# Altium schematic symbol library jlcpcb_2025_04_capacitors_extended_0201.schlib: 1175 symbols (part 5 of 7)
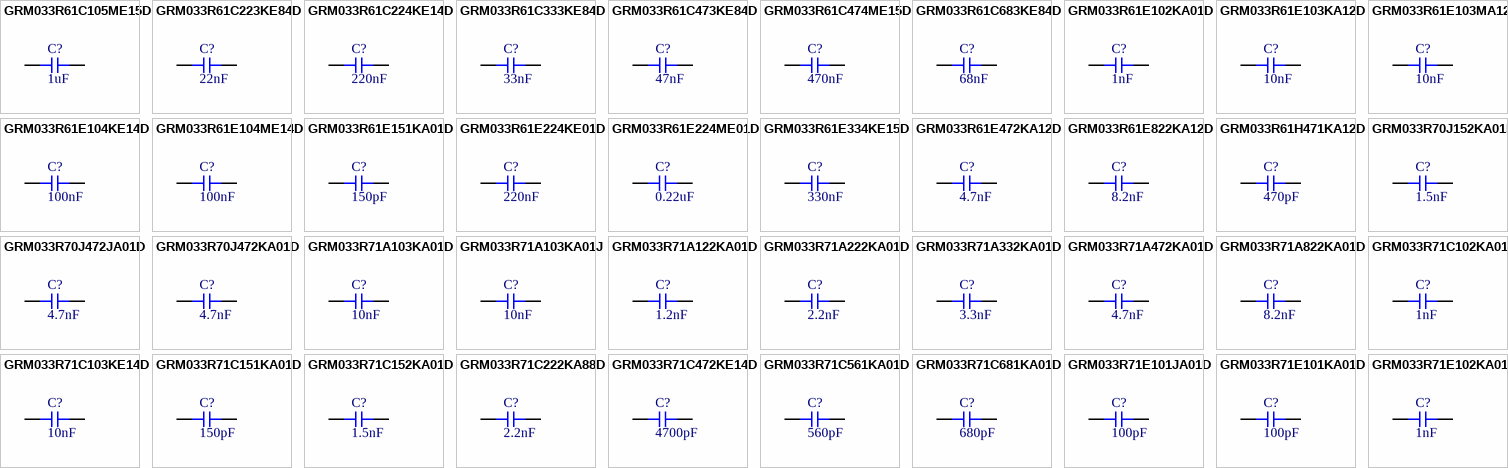
[diagram p33: symbols GRM033R61C105ME15D to GRM033R71E102KA01D]

## GRM033R61H471KA12D
designator C?  Capacitance: 470pF  (hidden comment: *)
Capacitor, Ceramic (MLCC), 470pF, ±10%, null, X5R, ±10%, SMD 0201; Manufacturer: Murata Electronics; Manufacturer Part Number: GRM033R61H471KA12D; Package Size: 0201; JLCPCB Basic Part: No; JLCPCB Part Number: C710827; Supplier 1: LCSC; Category: Capacitors - MLCC; Supplier Part Number 1: C710827; Tolerance: ±10%; Voltage Rating: null; Temperature Coefficient: X5R; RoHS: Yes; ComponentLink1Description: Datasheet; ComponentLink1URL: https://wmsc.lcsc.com/wmsc/upload/file/pdf/v2/lcsc/2308111812_Murata-Electronics-GRM033R61H471KA12D_C710827.pdf; ComponentLink2Description: JLCPCB Part URL; ComponentLink2URL: https://jlcpcb.com/partdetail/C710827; ComponentLink3Description: LCSC Part URL; ComponentLink3URL: https://lcsc.com/product-detail/Multilayer-Ceramic-Capacitors-MLCC---SMD-SMT_Murata-Electronics-Murata-Electronics-GRM033R61H471KA12D_C710827.html
footprint CAP-0201 (0201 (0603M) Capacitor)
pins: 1, 2

## GRM033R70J152KA01D
designator C?  Capacitance: 1.5nF  (hidden comment: *)
Capacitor, Ceramic (MLCC), 1.5nF, ±10%, 6.3V, X7R, ±10%, SMD 0201; Manufacturer: Murata Electronics; Manufacturer Part Number: GRM033R70J152KA01D; Package Size: 0201; JLCPCB Basic Part: No; JLCPCB Part Number: C2173993; Supplier 1: LCSC; Category: Capacitors - MLCC; Supplier Part Number 1: C2173993; Tolerance: ±10%; Voltage Rating: 6.3V; Temperature Coefficient: X7R; RoHS: Yes; ComponentLink1Description: Datasheet; ComponentLink1URL: https://wmsc.lcsc.com/wmsc/upload/file/pdf/v2/lcsc/2108051830_Murata-Electronics-GRM033R70J152KA01D_C2173993.pdf; ComponentLink2Description: JLCPCB Part URL; ComponentLink2URL: https://jlcpcb.com/partdetail/C2173993; ComponentLink3Description: LCSC Part URL; ComponentLink3URL: https://lcsc.com/product-detail/Multilayer-Ceramic-Capacitors-MLCC---SMD-SMT_Murata-Electronics-Murata-Electronics-GRM033R70J152KA01D_C2173993.html
footprint CAP-0201 (0201 (0603M) Capacitor)
pins: 1, 2

## GRM033R70J472JA01D
designator C?  Capacitance: 4.7nF  (hidden comment: *)
Capacitor, Ceramic (MLCC), 4.7nF, ±5%, 6.3V, X7R, ±5%, SMD 0201; Manufacturer: Murata Electronics; Manufacturer Part Number: GRM033R70J472JA01D; Package Size: 0201; JLCPCB Basic Part: No; JLCPCB Part Number: C909904; Supplier 1: LCSC; Category: Capacitors - MLCC; Supplier Part Number 1: C909904; Tolerance: ±5%; Voltage Rating: 6.3V; Temperature Coefficient: X7R; RoHS: Yes; ComponentLink1Description: Datasheet; ComponentLink1URL: https://wmsc.lcsc.com/wmsc/upload/file/pdf/v2/lcsc/2201242100_Murata-Electronics-GRM033R70J472JA01D_C909904.pdf; ComponentLink2Description: JLCPCB Part URL; ComponentLink2URL: https://jlcpcb.com/partdetail/C909904; ComponentLink3Description: LCSC Part URL; ComponentLink3URL: https://lcsc.com/product-detail/Multilayer-Ceramic-Capacitors-MLCC---SMD-SMT_Murata-Electronics-Murata-Electronics-GRM033R70J472JA01D_C909904.html
footprint CAP-0201 (0201 (0603M) Capacitor)
pins: 1, 2

## GRM033R70J472KA01D
designator C?  Capacitance: 4.7nF  (hidden comment: *)
Capacitor, Ceramic (MLCC), 4.7nF, ±10%, 6.3V, X7R, ±10%, SMD 0201; Manufacturer: Murata Electronics; Manufacturer Part Number: GRM033R70J472KA01D; Package Size: 0201; JLCPCB Basic Part: No; JLCPCB Part Number: C237568; Supplier 1: LCSC; Category: Capacitors - MLCC; Supplier Part Number 1: C237568; Tolerance: ±10%; Voltage Rating: 6.3V; Temperature Coefficient: X7R; RoHS: Yes; ComponentLink1Description: Datasheet; ComponentLink1URL: https://wmsc.lcsc.com/wmsc/upload/file/pdf/v2/lcsc/2109152030_Murata-Electronics-GRM033R70J472KA01D_C237568.pdf; ComponentLink2Description: JLCPCB Part URL; ComponentLink2URL: https://jlcpcb.com/partdetail/C237568; ComponentLink3Description: LCSC Part URL; ComponentLink3URL: https://lcsc.com/product-detail/Multilayer-Ceramic-Capacitors-MLCC---SMD-SMT_Murata-Electronics-Murata-Electronics-GRM033R70J472KA01D_C237568.html
footprint CAP-0201 (0201 (0603M) Capacitor)
pins: 1, 2

## GRM033R71A103KA01D
designator C?  Capacitance: 10nF  (hidden comment: *)
Capacitor, Ceramic (MLCC), 10nF, ±10%, 10V, X7R, ±10%, SMD 0201; Manufacturer: Murata Electronics; Manufacturer Part Number: GRM033R71A103KA01D; Package Size: 0201; JLCPCB Basic Part: No; JLCPCB Part Number: C76941; Supplier 1: LCSC; Category: Capacitors - MLCC; Supplier Part Number 1: C76941; Tolerance: ±10%; Voltage Rating: 10V; Temperature Coefficient: X7R; RoHS: Yes; ComponentLink1Description: Datasheet; ComponentLink1URL: https://wmsc.lcsc.com/wmsc/upload/file/pdf/v2/lcsc/1811081513_Murata-Electronics-GRM033R71A103KA01D_C76941.pdf; ComponentLink2Description: JLCPCB Part URL; ComponentLink2URL: https://jlcpcb.com/partdetail/C76941; ComponentLink3Description: LCSC Part URL; ComponentLink3URL: https://lcsc.com/product-detail/Multilayer-Ceramic-Capacitors-MLCC---SMD-SMT_Murata-Electronics-Murata-Electronics-GRM033R71A103KA01D_C76941.html
footprint CAP-0201 (0201 (0603M) Capacitor)
pins: 1, 2

## GRM033R71A103KA01J
designator C?  Capacitance: 10nF  (hidden comment: *)
Capacitor, Ceramic (MLCC), 10nF, ±10%, 10V, X7R, ±10%, SMD 0201; Manufacturer: Murata Electronics; Manufacturer Part Number: GRM033R71A103KA01J; Package Size: 0201; JLCPCB Basic Part: No; JLCPCB Part Number: C882546; Supplier 1: LCSC; Category: Capacitors - MLCC; Supplier Part Number 1: C882546; Tolerance: ±10%; Voltage Rating: 10V; Temperature Coefficient: X7R; RoHS: Yes; ComponentLink1Description: Datasheet; ComponentLink1URL: https://wmsc.lcsc.com/wmsc/upload/file/pdf/v2/lcsc/2204152015_Murata-Electronics-GRM033R71A103KA01J_C882546.pdf; ComponentLink2Description: JLCPCB Part URL; ComponentLink2URL: https://jlcpcb.com/partdetail/C882546; ComponentLink3Description: LCSC Part URL; ComponentLink3URL: https://lcsc.com/product-detail/Multilayer-Ceramic-Capacitors-MLCC---SMD-SMT_Murata-Electronics-Murata-Electronics-GRM033R71A103KA01J_C882546.html
footprint CAP-0201 (0201 (0603M) Capacitor)
pins: 1, 2

## GRM033R71A122KA01D
designator C?  Capacitance: 1.2nF  (hidden comment: *)
Capacitor, Ceramic (MLCC), 1.2nF, ±10%, 10V, X7R, ±10%, SMD 0201; Manufacturer: Murata Electronics; Manufacturer Part Number: GRM033R71A122KA01D; Package Size: 0201; JLCPCB Basic Part: No; JLCPCB Part Number: C913747; Supplier 1: LCSC; Category: Capacitors - MLCC; Supplier Part Number 1: C913747; Tolerance: ±10%; Voltage Rating: 10V; Temperature Coefficient: X7R; RoHS: Yes; ComponentLink1Description: Datasheet; ComponentLink1URL: https://wmsc.lcsc.com/wmsc/upload/file/pdf/v2/lcsc/2302062030_Murata-Electronics-GRM033R71A122KA01D_C913747.pdf; ComponentLink2Description: JLCPCB Part URL; ComponentLink2URL: https://jlcpcb.com/partdetail/C913747; ComponentLink3Description: LCSC Part URL; ComponentLink3URL: https://lcsc.com/product-detail/Multilayer-Ceramic-Capacitors-MLCC---SMD-SMT_Murata-Electronics-Murata-Electronics-GRM033R71A122KA01D_C913747.html
footprint CAP-0201 (0201 (0603M) Capacitor)
pins: 1, 2

## GRM033R71A222KA01D
designator C?  Capacitance: 2.2nF  (hidden comment: *)
Capacitor, Ceramic (MLCC), 2.2nF, ±10%, 10V, X7R, ±10%, SMD 0201; Manufacturer: Murata Electronics; Manufacturer Part Number: GRM033R71A222KA01D; Package Size: 0201; JLCPCB Basic Part: No; JLCPCB Part Number: C161479; Supplier 1: LCSC; Category: Capacitors - MLCC; Supplier Part Number 1: C161479; Tolerance: ±10%; Voltage Rating: 10V; Temperature Coefficient: X7R; RoHS: Yes; ComponentLink1Description: Datasheet; ComponentLink1URL: https://wmsc.lcsc.com/wmsc/upload/file/pdf/v2/lcsc/2304140030_Murata-Electronics-GRM033R71A222KA01D_C161479.pdf; ComponentLink2Description: JLCPCB Part URL; ComponentLink2URL: https://jlcpcb.com/partdetail/C161479; ComponentLink3Description: LCSC Part URL; ComponentLink3URL: https://lcsc.com/product-detail/Multilayer-Ceramic-Capacitors-MLCC---SMD-SMT_Murata-Electronics-Murata-Electronics-GRM033R71A222KA01D_C161479.html
footprint CAP-0201 (0201 (0603M) Capacitor)
pins: 1, 2

## GRM033R71A332KA01D
designator C?  Capacitance: 3.3nF  (hidden comment: *)
Capacitor, Ceramic (MLCC), 3.3nF, ±10%, 10V, X7R, ±10%, SMD 0201; Manufacturer: Murata Electronics; Manufacturer Part Number: GRM033R71A332KA01D; Package Size: 0201; JLCPCB Basic Part: No; JLCPCB Part Number: C710832; Supplier 1: LCSC; Category: Capacitors - MLCC; Supplier Part Number 1: C710832; Tolerance: ±10%; Voltage Rating: 10V; Temperature Coefficient: X7R; RoHS: Yes; ComponentLink1Description: Datasheet; ComponentLink1URL: https://wmsc.lcsc.com/wmsc/upload/file/pdf/v2/lcsc/2304140030_Murata-Electronics-GRM033R71A332KA01D_C710832.pdf; ComponentLink2Description: JLCPCB Part URL; ComponentLink2URL: https://jlcpcb.com/partdetail/C710832; ComponentLink3Description: LCSC Part URL; ComponentLink3URL: https://lcsc.com/product-detail/Multilayer-Ceramic-Capacitors-MLCC---SMD-SMT_Murata-Electronics-Murata-Electronics-GRM033R71A332KA01D_C710832.html
footprint CAP-0201 (0201 (0603M) Capacitor)
pins: 1, 2

## GRM033R71A472KA01D
designator C?  Capacitance: 4.7nF  (hidden comment: *)
Capacitor, Ceramic (MLCC), 4.7nF, ±10%, 10V, X7R, ±10%, SMD 0201; Manufacturer: Murata Electronics; Manufacturer Part Number: GRM033R71A472KA01D; Package Size: 0201; JLCPCB Basic Part: No; JLCPCB Part Number: C85927; Supplier 1: LCSC; Category: Capacitors - MLCC; Supplier Part Number 1: C85927; Tolerance: ±10%; Voltage Rating: 10V; Temperature Coefficient: X7R; RoHS: Yes; ComponentLink1Description: Datasheet; ComponentLink1URL: https://wmsc.lcsc.com/wmsc/upload/file/pdf/v2/lcsc/2304140030_Murata-Electronics-GRM033R71A472KA01D_C85927.pdf; ComponentLink2Description: JLCPCB Part URL; ComponentLink2URL: https://jlcpcb.com/partdetail/C85927; ComponentLink3Description: LCSC Part URL; ComponentLink3URL: https://lcsc.com/product-detail/Multilayer-Ceramic-Capacitors-MLCC---SMD-SMT_Murata-Electronics-Murata-Electronics-GRM033R71A472KA01D_C85927.html
footprint CAP-0201 (0201 (0603M) Capacitor)
pins: 1, 2

## GRM033R71A822KA01D
designator C?  Capacitance: 8.2nF  (hidden comment: *)
Capacitor, Ceramic (MLCC), 8.2nF, ±10%, 10V, X7R, ±10%, SMD 0201; Manufacturer: Murata Electronics; Manufacturer Part Number: GRM033R71A822KA01D; Package Size: 0201; JLCPCB Basic Part: No; JLCPCB Part Number: C2168104; Supplier 1: LCSC; Category: Capacitors - MLCC; Supplier Part Number 1: C2168104; Tolerance: ±10%; Voltage Rating: 10V; Temperature Coefficient: X7R; RoHS: Yes; ComponentLink1Description: Datasheet; ComponentLink1URL: https://wmsc.lcsc.com/wmsc/upload/file/pdf/v2/lcsc/2308111716_Murata-Electronics-GRM033R71A822KA01D_C2168104.pdf; ComponentLink2Description: JLCPCB Part URL; ComponentLink2URL: https://jlcpcb.com/partdetail/C2168104; ComponentLink3Description: LCSC Part URL; ComponentLink3URL: https://lcsc.com/product-detail/Multilayer-Ceramic-Capacitors-MLCC---SMD-SMT_Murata-Electronics-Murata-Electronics-GRM033R71A822KA01D_C2168104.html
footprint CAP-0201 (0201 (0603M) Capacitor)
pins: 1, 2

## GRM033R71C102KA01D
designator C?  Capacitance: 1nF  (hidden comment: *)
Capacitor, Ceramic (MLCC), 1nF, ±10%, 16V, X7R, ±10%, SMD 0201; Manufacturer: Murata Electronics; Manufacturer Part Number: GRM033R71C102KA01D; Package Size: 0201; JLCPCB Basic Part: No; JLCPCB Part Number: C76942; Supplier 1: LCSC; Category: Capacitors - MLCC; Supplier Part Number 1: C76942; Tolerance: ±10%; Voltage Rating: 16V; Temperature Coefficient: X7R; RoHS: Yes; ComponentLink1Description: Datasheet; ComponentLink1URL: https://wmsc.lcsc.com/wmsc/upload/file/pdf/v2/lcsc/1811081517_Murata-Electronics-GRM033R71C102KA01D_C76942.pdf; ComponentLink2Description: JLCPCB Part URL; ComponentLink2URL: https://jlcpcb.com/partdetail/C76942; ComponentLink3Description: LCSC Part URL; ComponentLink3URL: https://lcsc.com/product-detail/Multilayer-Ceramic-Capacitors-MLCC---SMD-SMT_Murata-Electronics-Murata-Electronics-GRM033R71C102KA01D_C76942.html
footprint CAP-0201 (0201 (0603M) Capacitor)
pins: 1, 2

## GRM033R71C103KE14D
designator C?  Capacitance: 10nF  (hidden comment: *)
Capacitor, Ceramic (MLCC), 10nF, ±10%, 16V, X7R, ±10%, SMD 0201; Manufacturer: Murata Electronics; Manufacturer Part Number: GRM033R71C103KE14D; Package Size: 0201; JLCPCB Basic Part: No; JLCPCB Part Number: C161481; Supplier 1: LCSC; Category: Capacitors - MLCC; Supplier Part Number 1: C161481; Tolerance: ±10%; Voltage Rating: 16V; Temperature Coefficient: X7R; RoHS: Yes; ComponentLink1Description: Datasheet; ComponentLink1URL: https://wmsc.lcsc.com/wmsc/upload/file/pdf/v2/lcsc/2304140030_Murata-Electronics-GRM033R71C103KE14D_C161481.pdf; ComponentLink2Description: JLCPCB Part URL; ComponentLink2URL: https://jlcpcb.com/partdetail/C161481; ComponentLink3Description: LCSC Part URL; ComponentLink3URL: https://lcsc.com/product-detail/Multilayer-Ceramic-Capacitors-MLCC---SMD-SMT_Murata-Electronics-Murata-Electronics-GRM033R71C103KE14D_C161481.html
footprint CAP-0201 (0201 (0603M) Capacitor)
pins: 1, 2

## GRM033R71C151KA01D
designator C?  Capacitance: 150pF  (hidden comment: *)
Capacitor, Ceramic (MLCC), 150pF, ±10%, 16V, X7R, ±10%, SMD 0201; Manufacturer: Murata Electronics; Manufacturer Part Number: GRM033R71C151KA01D; Package Size: 0201; JLCPCB Basic Part: No; JLCPCB Part Number: C2168106; Supplier 1: LCSC; Category: Capacitors - MLCC; Supplier Part Number 1: C2168106; Tolerance: ±10%; Voltage Rating: 16V; Temperature Coefficient: X7R; RoHS: Yes; ComponentLink1Description: Datasheet; ComponentLink1URL: https://wmsc.lcsc.com/wmsc/upload/file/pdf/v2/lcsc/2308111716_Murata-Electronics-GRM033R71C151KA01D_C2168106.pdf; ComponentLink2Description: JLCPCB Part URL; ComponentLink2URL: https://jlcpcb.com/partdetail/C2168106; ComponentLink3Description: LCSC Part URL; ComponentLink3URL: https://lcsc.com/product-detail/Multilayer-Ceramic-Capacitors-MLCC---SMD-SMT_Murata-Electronics-Murata-Electronics-GRM033R71C151KA01D_C2168106.html
footprint CAP-0201 (0201 (0603M) Capacitor)
pins: 1, 2

## GRM033R71C152KA01D
designator C?  Capacitance: 1.5nF  (hidden comment: *)
Capacitor, Ceramic (MLCC), 1.5nF, ±10%, 16V, X7R, ±10%, SMD 0201; Manufacturer: Murata Electronics; Manufacturer Part Number: GRM033R71C152KA01D; Package Size: 0201; JLCPCB Basic Part: No; JLCPCB Part Number: C161482; Supplier 1: LCSC; Category: Capacitors - MLCC; Supplier Part Number 1: C161482; Tolerance: ±10%; Voltage Rating: 16V; Temperature Coefficient: X7R; RoHS: Yes; ComponentLink1Description: Datasheet; ComponentLink1URL: https://wmsc.lcsc.com/wmsc/upload/file/pdf/v2/lcsc/2304140030_Murata-Electronics-GRM033R71C152KA01D_C161482.pdf; ComponentLink2Description: JLCPCB Part URL; ComponentLink2URL: https://jlcpcb.com/partdetail/C161482; ComponentLink3Description: LCSC Part URL; ComponentLink3URL: https://lcsc.com/product-detail/Multilayer-Ceramic-Capacitors-MLCC---SMD-SMT_Murata-Electronics-Murata-Electronics-GRM033R71C152KA01D_C161482.html
footprint CAP-0201 (0201 (0603M) Capacitor)
pins: 1, 2

## GRM033R71C222KA88D
designator C?  Capacitance: 2.2nF  (hidden comment: *)
Capacitor, Ceramic (MLCC), 2.2nF, ±10%, 16V, X7R, ±10%, SMD 0201; Manufacturer: Murata Electronics; Manufacturer Part Number: GRM033R71C222KA88D; Package Size: 0201; JLCPCB Basic Part: No; JLCPCB Part Number: C97860; Supplier 1: LCSC; Category: Capacitors - MLCC; Supplier Part Number 1: C97860; Tolerance: ±10%; Voltage Rating: 16V; Temperature Coefficient: X7R; RoHS: Yes; ComponentLink1Description: Datasheet; ComponentLink1URL: https://wmsc.lcsc.com/wmsc/upload/file/pdf/v2/lcsc/1811081531_Murata-Electronics-GRM033R71C222KA88D_C97860.pdf; ComponentLink2Description: JLCPCB Part URL; ComponentLink2URL: https://jlcpcb.com/partdetail/C97860; ComponentLink3Description: LCSC Part URL; ComponentLink3URL: https://lcsc.com/product-detail/Multilayer-Ceramic-Capacitors-MLCC---SMD-SMT_Murata-Electronics-Murata-Electronics-GRM033R71C222KA88D_C97860.html
footprint CAP-0201 (0201 (0603M) Capacitor)
pins: 1, 2

## GRM033R71C472KE14D
designator C?  Capacitance: 4700pF  (hidden comment: *)
Capacitor, Ceramic (MLCC), 4700pF, ±10%, 16V, X7R, ±10%, SMD 0201; Manufacturer: Murata Electronics; Manufacturer Part Number: GRM033R71C472KE14D; Package Size: 0201; JLCPCB Basic Part: No; JLCPCB Part Number: C426106; Supplier 1: LCSC; Category: Capacitors - MLCC; Supplier Part Number 1: C426106; Tolerance: ±10%; Voltage Rating: 16V; Temperature Coefficient: X7R; RoHS: Yes; ComponentLink1Description: Datasheet; ComponentLink1URL: https://wmsc.lcsc.com/wmsc/upload/file/pdf/v2/lcsc/2304140030_Murata-Electronics-GRM033R71C472KE14D_C426106.pdf; ComponentLink2Description: JLCPCB Part URL; ComponentLink2URL: https://jlcpcb.com/partdetail/C426106; ComponentLink3Description: LCSC Part URL; ComponentLink3URL: https://lcsc.com/product-detail/Multilayer-Ceramic-Capacitors-MLCC---SMD-SMT_Murata-Electronics-Murata-Electronics-GRM033R71C472KE14D_C426106.html
footprint CAP-0201 (0201 (0603M) Capacitor)
pins: 1, 2

## GRM033R71C561KA01D
designator C?  Capacitance: 560pF  (hidden comment: *)
Capacitor, Ceramic (MLCC), 560pF, ±10%, 16V, X7R, ±10%, SMD 0201; Manufacturer: Murata Electronics; Manufacturer Part Number: GRM033R71C561KA01D; Package Size: 0201; JLCPCB Basic Part: No; JLCPCB Part Number: C913762; Supplier 1: LCSC; Category: Capacitors - MLCC; Supplier Part Number 1: C913762; Tolerance: ±10%; Voltage Rating: 16V; Temperature Coefficient: X7R; RoHS: Yes; ComponentLink1Description: Datasheet; ComponentLink1URL: https://wmsc.lcsc.com/wmsc/upload/file/pdf/v2/lcsc/2201131300_Murata-Electronics-GRM033R71C561KA01D_C913762.pdf; ComponentLink2Description: JLCPCB Part URL; ComponentLink2URL: https://jlcpcb.com/partdetail/C913762; ComponentLink3Description: LCSC Part URL; ComponentLink3URL: https://lcsc.com/product-detail/Multilayer-Ceramic-Capacitors-MLCC---SMD-SMT_Murata-Electronics-Murata-Electronics-GRM033R71C561KA01D_C913762.html
footprint CAP-0201 (0201 (0603M) Capacitor)
pins: 1, 2

## GRM033R71C681KA01D
designator C?  Capacitance: 680pF  (hidden comment: *)
Capacitor, Ceramic (MLCC), 680pF, ±10%, 16V, X7R, ±10%, SMD 0201; Manufacturer: Murata Electronics; Manufacturer Part Number: GRM033R71C681KA01D; Package Size: 0201; JLCPCB Basic Part: No; JLCPCB Part Number: C161484; Supplier 1: LCSC; Category: Capacitors - MLCC; Supplier Part Number 1: C161484; Tolerance: ±10%; Voltage Rating: 16V; Temperature Coefficient: X7R; RoHS: Yes; ComponentLink1Description: Datasheet; ComponentLink1URL: https://wmsc.lcsc.com/wmsc/upload/file/pdf/v2/lcsc/2304140030_Murata-Electronics-GRM033R71C681KA01D_C161484.pdf; ComponentLink2Description: JLCPCB Part URL; ComponentLink2URL: https://jlcpcb.com/partdetail/C161484; ComponentLink3Description: LCSC Part URL; ComponentLink3URL: https://lcsc.com/product-detail/Multilayer-Ceramic-Capacitors-MLCC---SMD-SMT_Murata-Electronics-Murata-Electronics-GRM033R71C681KA01D_C161484.html
footprint CAP-0201 (0201 (0603M) Capacitor)
pins: 1, 2

## GRM033R71E101JA01D
designator C?  Capacitance: 100pF  (hidden comment: *)
Capacitor, Ceramic (MLCC), 100pF, ±5%, 25V, X7R, ±5%, SMD 0201; Manufacturer: Murata Electronics; Manufacturer Part Number: GRM033R71E101JA01D; Package Size: 0201; JLCPCB Basic Part: No; JLCPCB Part Number: C161485; Supplier 1: LCSC; Category: Capacitors - MLCC; Supplier Part Number 1: C161485; Tolerance: ±5%; Voltage Rating: 25V; Temperature Coefficient: X7R; RoHS: Yes; ComponentLink1Description: Datasheet; ComponentLink1URL: https://wmsc.lcsc.com/wmsc/upload/file/pdf/v2/lcsc/2304140030_Murata-Electronics-GRM033R71E101JA01D_C161485.pdf; ComponentLink2Description: JLCPCB Part URL; ComponentLink2URL: https://jlcpcb.com/partdetail/C161485; ComponentLink3Description: LCSC Part URL; ComponentLink3URL: https://lcsc.com/product-detail/Multilayer-Ceramic-Capacitors-MLCC---SMD-SMT_Murata-Electronics-Murata-Electronics-GRM033R71E101JA01D_C161485.html
footprint CAP-0201 (0201 (0603M) Capacitor)
pins: 1, 2

## GRM033R71E101KA01D
designator C?  Capacitance: 100pF  (hidden comment: *)
Capacitor, Ceramic (MLCC), 100pF, ±10%, 25V, X7R, ±10%, SMD 0201; Manufacturer: Murata Electronics; Manufacturer Part Number: GRM033R71E101KA01D; Package Size: 0201; JLCPCB Basic Part: No; JLCPCB Part Number: C363927; Supplier 1: LCSC; Category: Capacitors - MLCC; Supplier Part Number 1: C363927; Tolerance: ±10%; Voltage Rating: 25V; Temperature Coefficient: X7R; RoHS: Yes; ComponentLink1Description: Datasheet; ComponentLink1URL: https://wmsc.lcsc.com/wmsc/upload/file/pdf/v2/lcsc/1912111437_Murata-Electronics-GRM033R71E101KA01D_C363927.pdf; ComponentLink2Description: JLCPCB Part URL; ComponentLink2URL: https://jlcpcb.com/partdetail/C363927; ComponentLink3Description: LCSC Part URL; ComponentLink3URL: https://lcsc.com/product-detail/Multilayer-Ceramic-Capacitors-MLCC---SMD-SMT_Murata-Electronics-Murata-Electronics-GRM033R71E101KA01D_C363927.html
footprint CAP-0201 (0201 (0603M) Capacitor)
pins: 1, 2

## GRM033R71E102KA01D
designator C?  Capacitance: 1nF  (hidden comment: *)
Capacitor, Ceramic (MLCC), 1nF, ±10%, 25V, X7R, ±10%, SMD 0201; Manufacturer: Murata Electronics; Manufacturer Part Number: GRM033R71E102KA01D; Package Size: 0201; JLCPCB Basic Part: No; JLCPCB Part Number: C76943; Supplier 1: LCSC; Category: Capacitors - MLCC; Supplier Part Number 1: C76943; Tolerance: ±10%; Voltage Rating: 25V; Temperature Coefficient: X7R; RoHS: Yes; ComponentLink1Description: Datasheet; ComponentLink1URL: https://wmsc.lcsc.com/wmsc/upload/file/pdf/v2/lcsc/1811081531_Murata-Electronics-GRM033R71E102KA01D_C76943.pdf; ComponentLink2Description: JLCPCB Part URL; ComponentLink2URL: https://jlcpcb.com/partdetail/C76943; ComponentLink3Description: LCSC Part URL; ComponentLink3URL: https://lcsc.com/product-detail/Multilayer-Ceramic-Capacitors-MLCC---SMD-SMT_Murata-Electronics-Murata-Electronics-GRM033R71E102KA01D_C76943.html
footprint CAP-0201 (0201 (0603M) Capacitor)
pins: 1, 2

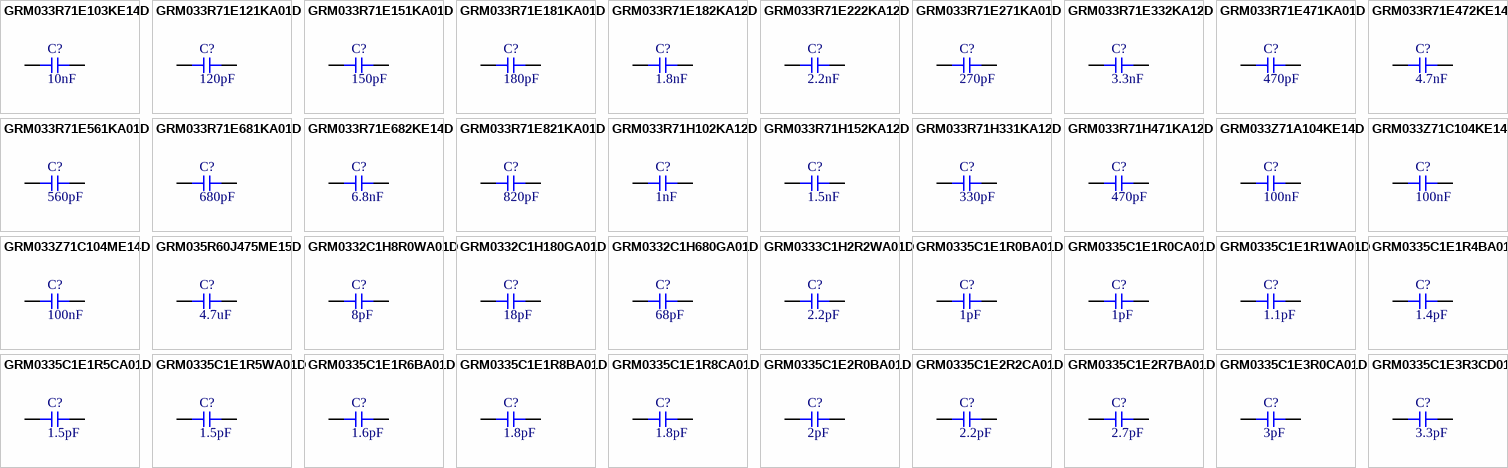
[diagram p19: symbols GRM033R71E103KE14D to GRM0335C1E3R3CD01D]

## GRM033R71E103KE14D
designator C?  Capacitance: 10nF  (hidden comment: *)
Capacitor, Ceramic (MLCC), 10nF, ±10%, 25V, X7R, ±10%, SMD 0201; Manufacturer: Murata Electronics; Manufacturer Part Number: GRM033R71E103KE14D; Package Size: 0201; JLCPCB Basic Part: No; JLCPCB Part Number: C85930; Supplier 1: LCSC; Category: Capacitors - MLCC; Supplier Part Number 1: C85930; Tolerance: ±10%; Voltage Rating: 25V; Temperature Coefficient: X7R; RoHS: Yes; ComponentLink1Description: Datasheet; ComponentLink1URL: https://wmsc.lcsc.com/wmsc/upload/file/pdf/v2/lcsc/2304140030_Murata-Electronics-GRM033R71E103KE14D_C85930.pdf; ComponentLink2Description: JLCPCB Part URL; ComponentLink2URL: https://jlcpcb.com/partdetail/C85930; ComponentLink3Description: LCSC Part URL; ComponentLink3URL: https://lcsc.com/product-detail/Multilayer-Ceramic-Capacitors-MLCC---SMD-SMT_Murata-Electronics-Murata-Electronics-GRM033R71E103KE14D_C85930.html
footprint CAP-0201 (0201 (0603M) Capacitor)
pins: 1, 2

## GRM033R71E121KA01D
designator C?  Capacitance: 120pF  (hidden comment: *)
Capacitor, Ceramic (MLCC), 120pF, ±10%, 25V, X7R, ±10%, SMD 0201; Manufacturer: Murata Electronics; Manufacturer Part Number: GRM033R71E121KA01D; Package Size: 0201; JLCPCB Basic Part: No; JLCPCB Part Number: C2168149; Supplier 1: LCSC; Category: Capacitors - MLCC; Supplier Part Number 1: C2168149; Tolerance: ±10%; Voltage Rating: 25V; Temperature Coefficient: X7R; RoHS: Yes; ComponentLink1Description: Datasheet; ComponentLink1URL: https://wmsc.lcsc.com/wmsc/upload/file/pdf/v2/lcsc/2308111716_Murata-Electronics-GRM033R71E121KA01D_C2168149.pdf; ComponentLink2Description: JLCPCB Part URL; ComponentLink2URL: https://jlcpcb.com/partdetail/C2168149; ComponentLink3Description: LCSC Part URL; ComponentLink3URL: https://lcsc.com/product-detail/Multilayer-Ceramic-Capacitors-MLCC---SMD-SMT_Murata-Electronics-Murata-Electronics-GRM033R71E121KA01D_C2168149.html
footprint CAP-0201 (0201 (0603M) Capacitor)
pins: 1, 2

## GRM033R71E151KA01D
designator C?  Capacitance: 150pF  (hidden comment: *)
Capacitor, Ceramic (MLCC), 150pF, ±10%, 25V, X7R, ±10%, SMD 0201; Manufacturer: Murata Electronics; Manufacturer Part Number: GRM033R71E151KA01D; Package Size: 0201; JLCPCB Basic Part: No; JLCPCB Part Number: C161486; Supplier 1: LCSC; Category: Capacitors - MLCC; Supplier Part Number 1: C161486; Tolerance: ±10%; Voltage Rating: 25V; Temperature Coefficient: X7R; RoHS: Yes; ComponentLink1Description: Datasheet; ComponentLink1URL: https://wmsc.lcsc.com/wmsc/upload/file/pdf/v2/lcsc/2304140030_Murata-Electronics-GRM033R71E151KA01D_C161486.pdf; ComponentLink2Description: JLCPCB Part URL; ComponentLink2URL: https://jlcpcb.com/partdetail/C161486; ComponentLink3Description: LCSC Part URL; ComponentLink3URL: https://lcsc.com/product-detail/Multilayer-Ceramic-Capacitors-MLCC---SMD-SMT_Murata-Electronics-Murata-Electronics-GRM033R71E151KA01D_C161486.html
footprint CAP-0201 (0201 (0603M) Capacitor)
pins: 1, 2

## GRM033R71E181KA01D
designator C?  Capacitance: 180pF  (hidden comment: *)
Capacitor, Ceramic (MLCC), 180pF, ±10%, 25V, X7R, ±10%, SMD 0201; Manufacturer: Murata Electronics; Manufacturer Part Number: GRM033R71E181KA01D; Package Size: 0201; JLCPCB Basic Part: No; JLCPCB Part Number: C913746; Supplier 1: LCSC; Category: Capacitors - MLCC; Supplier Part Number 1: C913746; Tolerance: ±10%; Voltage Rating: 25V; Temperature Coefficient: X7R; RoHS: Yes; ComponentLink1Description: Datasheet; ComponentLink1URL: https://wmsc.lcsc.com/wmsc/upload/file/pdf/v2/lcsc/2201131300_Murata-Electronics-GRM033R71E181KA01D_C913746.pdf; ComponentLink2Description: JLCPCB Part URL; ComponentLink2URL: https://jlcpcb.com/partdetail/C913746; ComponentLink3Description: LCSC Part URL; ComponentLink3URL: https://lcsc.com/product-detail/Multilayer-Ceramic-Capacitors-MLCC---SMD-SMT_Murata-Electronics-Murata-Electronics-GRM033R71E181KA01D_C913746.html
footprint CAP-0201 (0201 (0603M) Capacitor)
pins: 1, 2

## GRM033R71E182KA12D
designator C?  Capacitance: 1.8nF  (hidden comment: *)
Capacitor, Ceramic (MLCC), 1.8nF, ±10%, 25V, X7R, ±10%, SMD 0201; Manufacturer: Murata Electronics; Manufacturer Part Number: GRM033R71E182KA12D; Package Size: 0201; JLCPCB Basic Part: No; JLCPCB Part Number: C237560; Supplier 1: LCSC; Category: Capacitors - MLCC; Supplier Part Number 1: C237560; Tolerance: ±10%; Voltage Rating: 25V; Temperature Coefficient: X7R; RoHS: Yes; ComponentLink1Description: Datasheet; ComponentLink1URL: https://wmsc.lcsc.com/wmsc/upload/file/pdf/v2/lcsc/2304140030_Murata-Electronics-GRM033R71E182KA12D_C237560.pdf; ComponentLink2Description: JLCPCB Part URL; ComponentLink2URL: https://jlcpcb.com/partdetail/C237560; ComponentLink3Description: LCSC Part URL; ComponentLink3URL: https://lcsc.com/product-detail/Multilayer-Ceramic-Capacitors-MLCC---SMD-SMT_Murata-Electronics-Murata-Electronics-GRM033R71E182KA12D_C237560.html
footprint CAP-0201 (0201 (0603M) Capacitor)
pins: 1, 2

## GRM033R71E222KA12D
designator C?  Capacitance: 2.2nF  (hidden comment: *)
Capacitor, Ceramic (MLCC), 2.2nF, ±10%, 25V, X7R, ±10%, SMD 0201; Manufacturer: Murata Electronics; Manufacturer Part Number: GRM033R71E222KA12D; Package Size: 0201; JLCPCB Basic Part: No; JLCPCB Part Number: C161488; Supplier 1: LCSC; Category: Capacitors - MLCC; Supplier Part Number 1: C161488; Tolerance: ±10%; Voltage Rating: 25V; Temperature Coefficient: X7R; RoHS: Yes; ComponentLink1Description: Datasheet; ComponentLink1URL: https://wmsc.lcsc.com/wmsc/upload/file/pdf/v2/lcsc/2304140030_Murata-Electronics-GRM033R71E222KA12D_C161488.pdf; ComponentLink2Description: JLCPCB Part URL; ComponentLink2URL: https://jlcpcb.com/partdetail/C161488; ComponentLink3Description: LCSC Part URL; ComponentLink3URL: https://lcsc.com/product-detail/Multilayer-Ceramic-Capacitors-MLCC---SMD-SMT_Murata-Electronics-Murata-Electronics-GRM033R71E222KA12D_C161488.html
footprint CAP-0201 (0201 (0603M) Capacitor)
pins: 1, 2

## GRM033R71E271KA01D
designator C?  Capacitance: 270pF  (hidden comment: *)
Capacitor, Ceramic (MLCC), 270pF, ±10%, 25V, X7R, ±10%, SMD 0201; Manufacturer: Murata Electronics; Manufacturer Part Number: GRM033R71E271KA01D; Package Size: 0201; JLCPCB Basic Part: No; JLCPCB Part Number: C668345; Supplier 1: LCSC; Category: Capacitors - MLCC; Supplier Part Number 1: C668345; Tolerance: ±10%; Voltage Rating: 25V; Temperature Coefficient: X7R; RoHS: Yes; ComponentLink1Description: Datasheet; ComponentLink1URL: https://wmsc.lcsc.com/wmsc/upload/file/pdf/v2/lcsc/2105241313_Murata-Electronics-GRM033R71E271KA01D_C668345.pdf; ComponentLink2Description: JLCPCB Part URL; ComponentLink2URL: https://jlcpcb.com/partdetail/C668345; ComponentLink3Description: LCSC Part URL; ComponentLink3URL: https://lcsc.com/product-detail/Multilayer-Ceramic-Capacitors-MLCC---SMD-SMT_Murata-Electronics-Murata-Electronics-GRM033R71E271KA01D_C668345.html
footprint CAP-0201 (0201 (0603M) Capacitor)
pins: 1, 2

## GRM033R71E332KA12D
designator C?  Capacitance: 3.3nF  (hidden comment: *)
Capacitor, Ceramic (MLCC), 3.3nF, ±10%, 25V, X7R, ±10%, SMD 0201; Manufacturer: Murata Electronics; Manufacturer Part Number: GRM033R71E332KA12D; Package Size: 0201; JLCPCB Basic Part: No; JLCPCB Part Number: C385026; Supplier 1: LCSC; Category: Capacitors - MLCC; Supplier Part Number 1: C385026; Tolerance: ±10%; Voltage Rating: 25V; Temperature Coefficient: X7R; RoHS: Yes; ComponentLink1Description: Datasheet; ComponentLink1URL: https://wmsc.lcsc.com/wmsc/upload/file/pdf/v2/lcsc/1912111437_Murata-Electronics-GRM033R71E332KA12D_C385026.pdf; ComponentLink2Description: JLCPCB Part URL; ComponentLink2URL: https://jlcpcb.com/partdetail/C385026; ComponentLink3Description: LCSC Part URL; ComponentLink3URL: https://lcsc.com/product-detail/Multilayer-Ceramic-Capacitors-MLCC---SMD-SMT_Murata-Electronics-Murata-Electronics-GRM033R71E332KA12D_C385026.html
footprint CAP-0201 (0201 (0603M) Capacitor)
pins: 1, 2

## GRM033R71E471KA01D
designator C?  Capacitance: 470pF  (hidden comment: *)
Capacitor, Ceramic (MLCC), 470pF, ±10%, 25V, X7R, ±10%, SMD 0201; Manufacturer: Murata Electronics; Manufacturer Part Number: GRM033R71E471KA01D; Package Size: 0201; JLCPCB Basic Part: No; JLCPCB Part Number: C85932; Supplier 1: LCSC; Category: Capacitors - MLCC; Supplier Part Number 1: C85932; Tolerance: ±10%; Voltage Rating: 25V; Temperature Coefficient: X7R; RoHS: Yes; ComponentLink1Description: Datasheet; ComponentLink1URL: https://wmsc.lcsc.com/wmsc/upload/file/pdf/v2/lcsc/2304140030_Murata-Electronics-GRM033R71E471KA01D_C85932.pdf; ComponentLink2Description: JLCPCB Part URL; ComponentLink2URL: https://jlcpcb.com/partdetail/C85932; ComponentLink3Description: LCSC Part URL; ComponentLink3URL: https://lcsc.com/product-detail/Multilayer-Ceramic-Capacitors-MLCC---SMD-SMT_Murata-Electronics-Murata-Electronics-GRM033R71E471KA01D_C85932.html
footprint CAP-0201 (0201 (0603M) Capacitor)
pins: 1, 2

## GRM033R71E472KE14D
designator C?  Capacitance: 4.7nF  (hidden comment: *)
Capacitor, Ceramic (MLCC), 4.7nF, ±10%, 25V, X7R, ±10%, SMD 0201; Manufacturer: Murata Electronics; Manufacturer Part Number: GRM033R71E472KE14D; Package Size: 0201; JLCPCB Basic Part: No; JLCPCB Part Number: C85933; Supplier 1: LCSC; Category: Capacitors - MLCC; Supplier Part Number 1: C85933; Tolerance: ±10%; Voltage Rating: 25V; Temperature Coefficient: X7R; RoHS: Yes; ComponentLink1Description: Datasheet; ComponentLink1URL: https://wmsc.lcsc.com/wmsc/upload/file/pdf/v2/lcsc/2304140030_Murata-Electronics-GRM033R71E472KE14D_C85933.pdf; ComponentLink2Description: JLCPCB Part URL; ComponentLink2URL: https://jlcpcb.com/partdetail/C85933; ComponentLink3Description: LCSC Part URL; ComponentLink3URL: https://lcsc.com/product-detail/Multilayer-Ceramic-Capacitors-MLCC---SMD-SMT_Murata-Electronics-Murata-Electronics-GRM033R71E472KE14D_C85933.html
footprint CAP-0201 (0201 (0603M) Capacitor)
pins: 1, 2

## GRM033R71E561KA01D
designator C?  Capacitance: 560pF  (hidden comment: *)
Capacitor, Ceramic (MLCC), 560pF, ±10%, 25V, X7R, ±10%, SMD 0201; Manufacturer: Murata Electronics; Manufacturer Part Number: GRM033R71E561KA01D; Package Size: 0201; JLCPCB Basic Part: No; JLCPCB Part Number: C161489; Supplier 1: LCSC; Category: Capacitors - MLCC; Supplier Part Number 1: C161489; Tolerance: ±10%; Voltage Rating: 25V; Temperature Coefficient: X7R; RoHS: Yes; ComponentLink1Description: Datasheet; ComponentLink1URL: https://wmsc.lcsc.com/wmsc/upload/file/pdf/v2/lcsc/1811081546_Murata-Electronics-GRM033R71E561KA01D_C161489.pdf; ComponentLink2Description: JLCPCB Part URL; ComponentLink2URL: https://jlcpcb.com/partdetail/C161489; ComponentLink3Description: LCSC Part URL; ComponentLink3URL: https://lcsc.com/product-detail/Multilayer-Ceramic-Capacitors-MLCC---SMD-SMT_Murata-Electronics-Murata-Electronics-GRM033R71E561KA01D_C161489.html
footprint CAP-0201 (0201 (0603M) Capacitor)
pins: 1, 2

## GRM033R71E681KA01D
designator C?  Capacitance: 680pF  (hidden comment: *)
Capacitor, Ceramic (MLCC), 680pF, ±10%, 25V, X7R, ±10%, SMD 0201; Manufacturer: Murata Electronics; Manufacturer Part Number: GRM033R71E681KA01D; Package Size: 0201; JLCPCB Basic Part: No; JLCPCB Part Number: C161490; Supplier 1: LCSC; Category: Capacitors - MLCC; Supplier Part Number 1: C161490; Tolerance: ±10%; Voltage Rating: 25V; Temperature Coefficient: X7R; RoHS: Yes; ComponentLink1Description: Datasheet; ComponentLink1URL: https://wmsc.lcsc.com/wmsc/upload/file/pdf/v2/lcsc/1811081546_Murata-Electronics-GRM033R71E681KA01D_C161490.pdf; ComponentLink2Description: JLCPCB Part URL; ComponentLink2URL: https://jlcpcb.com/partdetail/C161490; ComponentLink3Description: LCSC Part URL; ComponentLink3URL: https://lcsc.com/product-detail/Multilayer-Ceramic-Capacitors-MLCC---SMD-SMT_Murata-Electronics-Murata-Electronics-GRM033R71E681KA01D_C161490.html
footprint CAP-0201 (0201 (0603M) Capacitor)
pins: 1, 2

## GRM033R71E682KE14D
designator C?  Capacitance: 6.8nF  (hidden comment: *)
Capacitor, Ceramic (MLCC), 6.8nF, ±10%, 25V, X7R, ±10%, SMD 0201; Manufacturer: Murata Electronics; Manufacturer Part Number: GRM033R71E682KE14D; Package Size: 0201; JLCPCB Basic Part: No; JLCPCB Part Number: C385027; Supplier 1: LCSC; Category: Capacitors - MLCC; Supplier Part Number 1: C385027; Tolerance: ±10%; Voltage Rating: 25V; Temperature Coefficient: X7R; RoHS: Yes; ComponentLink1Description: Datasheet; ComponentLink1URL: https://wmsc.lcsc.com/wmsc/upload/file/pdf/v2/lcsc/2109092030_Murata-Electronics-GRM033R71E682KE14D_C385027.pdf; ComponentLink2Description: JLCPCB Part URL; ComponentLink2URL: https://jlcpcb.com/partdetail/C385027; ComponentLink3Description: LCSC Part URL; ComponentLink3URL: https://lcsc.com/product-detail/Multilayer-Ceramic-Capacitors-MLCC---SMD-SMT_Murata-Electronics-Murata-Electronics-GRM033R71E682KE14D_C385027.html
footprint CAP-0201 (0201 (0603M) Capacitor)
pins: 1, 2

## GRM033R71E821KA01D
designator C?  Capacitance: 820pF  (hidden comment: *)
Capacitor, Ceramic (MLCC), 820pF, ±10%, 25V, X7R, ±10%, SMD 0201; Manufacturer: Murata Electronics; Manufacturer Part Number: GRM033R71E821KA01D; Package Size: 0201; JLCPCB Basic Part: No; JLCPCB Part Number: C185597; Supplier 1: LCSC; Category: Capacitors - MLCC; Supplier Part Number 1: C185597; Tolerance: ±10%; Voltage Rating: 25V; Temperature Coefficient: X7R; RoHS: Yes; ComponentLink1Description: Datasheet; ComponentLink1URL: https://wmsc.lcsc.com/wmsc/upload/file/pdf/v2/lcsc/1811081545_Murata-Electronics-GRM033R71E821KA01D_C185597.pdf; ComponentLink2Description: JLCPCB Part URL; ComponentLink2URL: https://jlcpcb.com/partdetail/C185597; ComponentLink3Description: LCSC Part URL; ComponentLink3URL: https://lcsc.com/product-detail/Multilayer-Ceramic-Capacitors-MLCC---SMD-SMT_Murata-Electronics-Murata-Electronics-GRM033R71E821KA01D_C185597.html
footprint CAP-0201 (0201 (0603M) Capacitor)
pins: 1, 2

## GRM033R71H102KA12D
designator C?  Capacitance: 1nF  (hidden comment: *)
Capacitor, Ceramic (MLCC), 1nF, ±10%, 50V, X7R, ±10%, SMD 0201; Manufacturer: Murata Electronics; Manufacturer Part Number: GRM033R71H102KA12D; Package Size: 0201; JLCPCB Basic Part: No; JLCPCB Part Number: C85934; Supplier 1: LCSC; Category: Capacitors - MLCC; Supplier Part Number 1: C85934; Tolerance: ±10%; Voltage Rating: 50V; Temperature Coefficient: X7R; RoHS: Yes; ComponentLink1Description: Datasheet; ComponentLink1URL: https://wmsc.lcsc.com/wmsc/upload/file/pdf/v2/lcsc/2304140030_Murata-Electronics-GRM033R71H102KA12D_C85934.pdf; ComponentLink2Description: JLCPCB Part URL; ComponentLink2URL: https://jlcpcb.com/partdetail/C85934; ComponentLink3Description: LCSC Part URL; ComponentLink3URL: https://lcsc.com/product-detail/Multilayer-Ceramic-Capacitors-MLCC---SMD-SMT_Murata-Electronics-Murata-Electronics-GRM033R71H102KA12D_C85934.html
footprint CAP-0201 (0201 (0603M) Capacitor)
pins: 1, 2

## GRM033R71H152KA12D
designator C?  Capacitance: 1.5nF  (hidden comment: *)
Capacitor, Ceramic (MLCC), 1.5nF, ±10%, 50V, X7R, ±10%, SMD 0201; Manufacturer: Murata Electronics; Manufacturer Part Number: GRM033R71H152KA12D; Package Size: 0201; JLCPCB Basic Part: No; JLCPCB Part Number: C161492; Supplier 1: LCSC; Category: Capacitors - MLCC; Supplier Part Number 1: C161492; Tolerance: ±10%; Voltage Rating: 50V; Temperature Coefficient: X7R; RoHS: Yes; ComponentLink1Description: Datasheet; ComponentLink1URL: https://wmsc.lcsc.com/wmsc/upload/file/pdf/v2/lcsc/1811081546_Murata-Electronics-GRM033R71H152KA12D_C161492.pdf; ComponentLink2Description: JLCPCB Part URL; ComponentLink2URL: https://jlcpcb.com/partdetail/C161492; ComponentLink3Description: LCSC Part URL; ComponentLink3URL: https://lcsc.com/product-detail/Multilayer-Ceramic-Capacitors-MLCC---SMD-SMT_Murata-Electronics-Murata-Electronics-GRM033R71H152KA12D_C161492.html
footprint CAP-0201 (0201 (0603M) Capacitor)
pins: 1, 2

## GRM033R71H331KA12D
designator C?  Capacitance: 330pF  (hidden comment: *)
Capacitor, Ceramic (MLCC), 330pF, ±10%, null, X7R, ±10%, SMD 0201; Manufacturer: Murata Electronics; Manufacturer Part Number: GRM033R71H331KA12D; Package Size: 0201; JLCPCB Basic Part: No; JLCPCB Part Number: C237483; Supplier 1: LCSC; Category: Capacitors - MLCC; Supplier Part Number 1: C237483; Tolerance: ±10%; Voltage Rating: null; Temperature Coefficient: X7R; RoHS: Yes; ComponentLink1Description: Datasheet; ComponentLink1URL: https://wmsc.lcsc.com/wmsc/upload/file/pdf/v2/lcsc/2304140030_Murata-Electronics-GRM033R71H331KA12D_C237483.pdf; ComponentLink2Description: JLCPCB Part URL; ComponentLink2URL: https://jlcpcb.com/partdetail/C237483; ComponentLink3Description: LCSC Part URL; ComponentLink3URL: https://lcsc.com/product-detail/Multilayer-Ceramic-Capacitors-MLCC---SMD-SMT_Murata-Electronics-Murata-Electronics-GRM033R71H331KA12D_C237483.html
footprint CAP-0201 (0201 (0603M) Capacitor)
pins: 1, 2

## GRM033R71H471KA12D
designator C?  Capacitance: 470pF  (hidden comment: *)
Capacitor, Ceramic (MLCC), 470pF, ±10%, 50V, X7R, ±10%, SMD 0201; Manufacturer: Murata Electronics; Manufacturer Part Number: GRM033R71H471KA12D; Package Size: 0201; JLCPCB Basic Part: No; JLCPCB Part Number: C161493; Supplier 1: LCSC; Category: Capacitors - MLCC; Supplier Part Number 1: C161493; Tolerance: ±10%; Voltage Rating: 50V; Temperature Coefficient: X7R; RoHS: Yes; ComponentLink1Description: Datasheet; ComponentLink1URL: https://wmsc.lcsc.com/wmsc/upload/file/pdf/v2/lcsc/2304140030_Murata-Electronics-GRM033R71H471KA12D_C161493.pdf; ComponentLink2Description: JLCPCB Part URL; ComponentLink2URL: https://jlcpcb.com/partdetail/C161493; ComponentLink3Description: LCSC Part URL; ComponentLink3URL: https://lcsc.com/product-detail/Multilayer-Ceramic-Capacitors-MLCC---SMD-SMT_Murata-Electronics-Murata-Electronics-GRM033R71H471KA12D_C161493.html
footprint CAP-0201 (0201 (0603M) Capacitor)
pins: 1, 2

## GRM033Z71A104KE14D
designator C?  Capacitance: 100nF  (hidden comment: *)
Capacitor, Ceramic (MLCC), 100nF, ±10%, 10V, X7R, ±10%, SMD 0201; Manufacturer: Murata Electronics; Manufacturer Part Number: GRM033Z71A104KE14D; Package Size: 0201; JLCPCB Basic Part: No; JLCPCB Part Number: C161494; Supplier 1: LCSC; Category: Capacitors - MLCC; Supplier Part Number 1: C161494; Tolerance: ±10%; Voltage Rating: 10V; Temperature Coefficient: X7R; RoHS: Yes; ComponentLink1Description: Datasheet; ComponentLink1URL: https://wmsc.lcsc.com/wmsc/upload/file/pdf/v2/lcsc/1912111437_Murata-Electronics-GRM033Z71A104KE14D_C161494.pdf; ComponentLink2Description: JLCPCB Part URL; ComponentLink2URL: https://jlcpcb.com/partdetail/C161494; ComponentLink3Description: LCSC Part URL; ComponentLink3URL: https://lcsc.com/product-detail/Multilayer-Ceramic-Capacitors-MLCC---SMD-SMT_Murata-Electronics-Murata-Electronics-GRM033Z71A104KE14D_C161494.html
footprint CAP-0201 (0201 (0603M) Capacitor)
pins: 1, 2

## GRM033Z71C104KE14D
designator C?  Capacitance: 100nF  (hidden comment: *)
Capacitor, Ceramic (MLCC), 100nF, ±10%, 16V, X7R, ±10%, SMD 0201; Manufacturer: Murata Electronics; Manufacturer Part Number: GRM033Z71C104KE14D; Package Size: 0201; JLCPCB Basic Part: No; JLCPCB Part Number: C668346; Supplier 1: LCSC; Category: Capacitors - MLCC; Supplier Part Number 1: C668346; Tolerance: ±10%; Voltage Rating: 16V; Temperature Coefficient: X7R; RoHS: Yes; ComponentLink1Description: Datasheet; ComponentLink1URL: https://wmsc.lcsc.com/wmsc/upload/file/pdf/v2/lcsc/2105241313_Murata-Electronics-GRM033Z71C104KE14D_C668346.pdf; ComponentLink2Description: JLCPCB Part URL; ComponentLink2URL: https://jlcpcb.com/partdetail/C668346; ComponentLink3Description: LCSC Part URL; ComponentLink3URL: https://lcsc.com/product-detail/Multilayer-Ceramic-Capacitors-MLCC---SMD-SMT_Murata-Electronics-Murata-Electronics-GRM033Z71C104KE14D_C668346.html
footprint CAP-0201 (0201 (0603M) Capacitor)
pins: 1, 2

## GRM033Z71C104ME14D
designator C?  Capacitance: 100nF  (hidden comment: *)
Capacitor, Ceramic (MLCC), 100nF, ±20%, 16V, X7R, ±20%, SMD 0201; Manufacturer: Murata Electronics; Manufacturer Part Number: GRM033Z71C104ME14D; Package Size: 0201; JLCPCB Basic Part: No; JLCPCB Part Number: C3901090; Supplier 1: LCSC; Category: Capacitors - MLCC; Supplier Part Number 1: C3901090; Tolerance: ±20%; Voltage Rating: 16V; Temperature Coefficient: X7R; RoHS: Yes; ComponentLink1Description: Datasheet; ComponentLink1URL: https://wmsc.lcsc.com/wmsc/upload/file/pdf/v2/lcsc/2308111504_Murata-Electronics-GRM033Z71C104ME14D_C3901090.pdf; ComponentLink2Description: JLCPCB Part URL; ComponentLink2URL: https://jlcpcb.com/partdetail/C3901090; ComponentLink3Description: LCSC Part URL; ComponentLink3URL: https://lcsc.com/product-detail/Multilayer-Ceramic-Capacitors-MLCC---SMD-SMT_Murata-Electronics-Murata-Electronics-GRM033Z71C104ME14D_C3901090.html
footprint CAP-0201 (0201 (0603M) Capacitor)
pins: 1, 2
